# Altium footprint library дроссели и трансы.PcbLib: 41 footprints (part 3 of 3)
Each footprint in its own frame and in the unit in brackets; x right, y up, seen from the top. Pads: shape width x height; smd on the part's side, far side on the other; paste and mask are expansions set on the pad; w line width, h text height; cw(c..) or ccw(c..) is an arc to the next point about the centre after c.
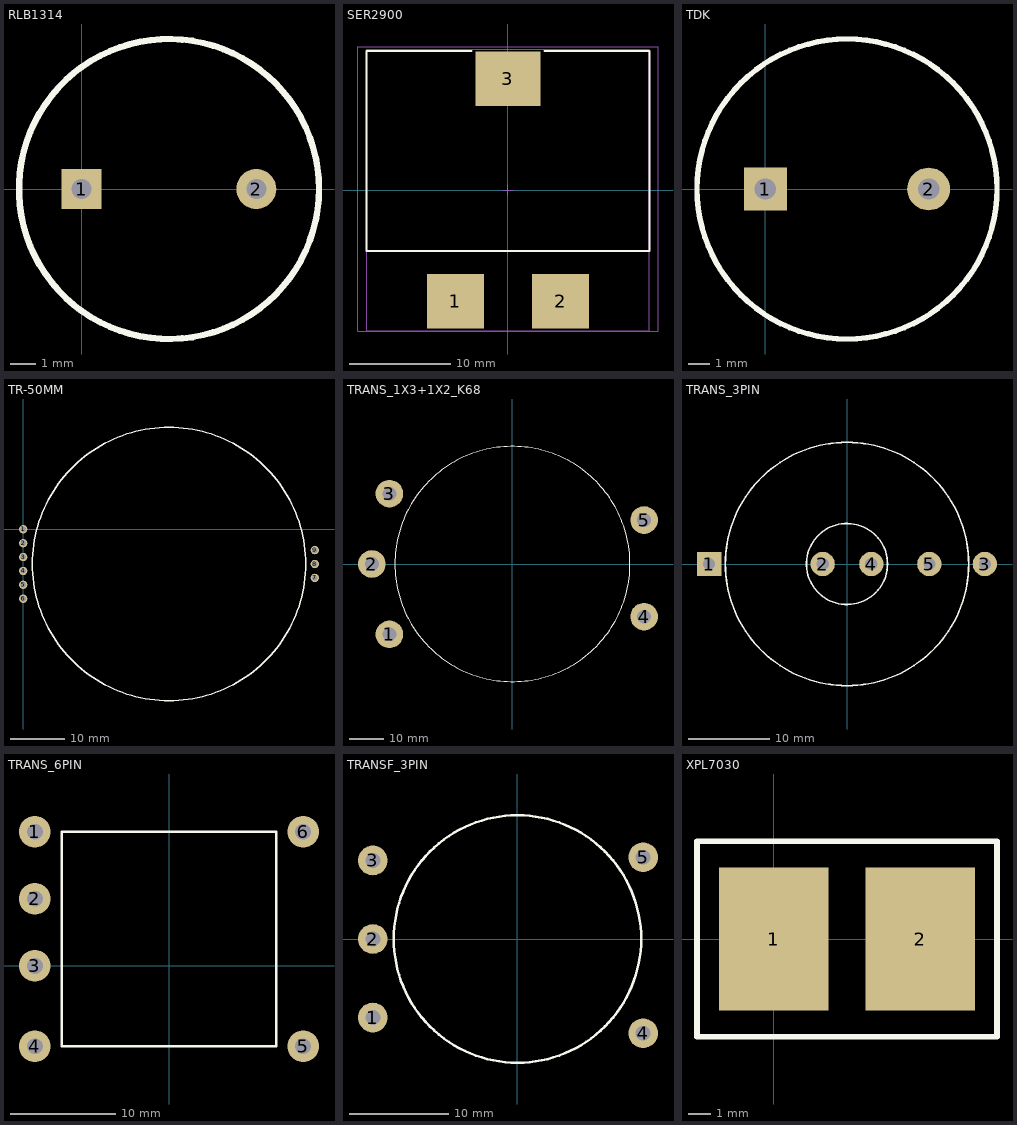
[diagram p2: the footprints below, top view; thin cyan lines are the x and y axes]

## RLB1314 [mm]
pads (2):
  rect 1.6x1.6 hole 0.8: 1(0,0)
  round 1.6 hole 0.8: 2(6.985,0)
Top Overlay:
  circle w0.254: c3.492,0 r6

## SER2900 [mm]
height 17.78
pads (3):
  rect 5.6x5.4 smd mask+0.025: 1(-5.2,-11) 2(5.2,-11)
  rect 6.4x5.4 smd mask+0.025: 3(0,11)
Top Overlay:
  lines w0.2: -3.6,13.75 -14,13.75 -14,-6.05 14,-6.05 14,13.75 3.6,13.75
Mechanical 14:
  lines w0.1: -13.97,-13.95 -13.97,13.95 13.97,13.95 13.97,-13.95 -13.97,-13.95
Mechanical 15:
  lines w0.05: -14.85,-14 -14.85,14.2 14.85,14.2 14.85,-14 -14.85,-14
  lines w0.1: -0.5,0 0.5,0 ; 0,-0.5 0,0.5
3D body "User Library-SER2918.STEP": height 17.2, standoff 0, extent -13.5,-13.308 13.5,13.399

## TDK [mm]
pads (2):
  rect 2x2 hole 1: 1(0,0)
  round 2 hole 1: 2(7.62,0)
Top Overlay:
  circle w0.254: c3.81,0 r7

## TR-50MM [mil]
pads (9):
  round 60 hole 38: 1(0,0) 2(0,-100) 3(0,-200) 4(0,-300) 5(0,-400) 6(0,-500) 7(2100,-350) 8(2100,-250) 9(2100,-150)
Top Overlay:
  circle w10: c1050,-250 r984.25

## TRANS_1X3+1X2_K68 [mm]
pads (5):
  round 8 hole 4: 1(-35.56,-20.32) 2(-40.64,0) 3(-35.56,20.32) 4(38.1,-15.24) 5(38.1,12.7)
Top Overlay:
  circle w0.254: c0,0 r34

## TRANS_3PIN [mm]
pads (5):
  rect 3x3 hole 1.5: 1(-17,0)
  round 3 hole 1.5: 2(-3,0) 3(17,0) 4(3,0) 5(10.16,0)
Top Overlay:
  circle w0.2: c0,0 r15
  circle w0.2: c0,0 r5

## TRANS_6PIN [mm]
pads (6):
  round 3 hole 1.5: 1(-12.7,12.7) 2(-12.7,6.35) 3(-12.7,0) 4(-12.7,-7.62) 5(12.7,-7.62) 6(12.7,12.7)
Top Overlay:
  lines w0.254: -10.16,-7.62 10.16,-7.62 10.16,12.7 -10.16,12.7 -10.16,-7.62

## TRANSF_3PIN [mm]
pads (5):
  round 3 hole 1.5: 1(-14.605,-7.938) 2(-14.605,0) 3(-14.605,7.938) 4(12.7,-9.525) 5(12.7,8.255)
Top Overlay:
  circle w0.254: c0,0 r12.5

## XPL7030 [mm]
pads (2):
  rect 5x6.5 smd: 1(0,0) 2(6.667,0)
Top Overlay:
  lines w0.254: -3.492,-4.445 10.16,-4.445 10.16,4.445 -3.492,4.445 -3.492,-4.445